# Altium footprint library Wurth_Elektronik_Electromechanic_Wire_to_Board_Connectors_rev16a.PCBLIB: 662 footprints (part 27 of 42)
Each footprint in its own frame and in the unit in brackets; x right, y up, seen from the top. Pads: shape width x height; smd on the part's side, far side on the other; paste and mask are expansions set on the pad; w line width, h text height; cw(c..) or ccw(c..) is an arc to the next point about the centre after c.
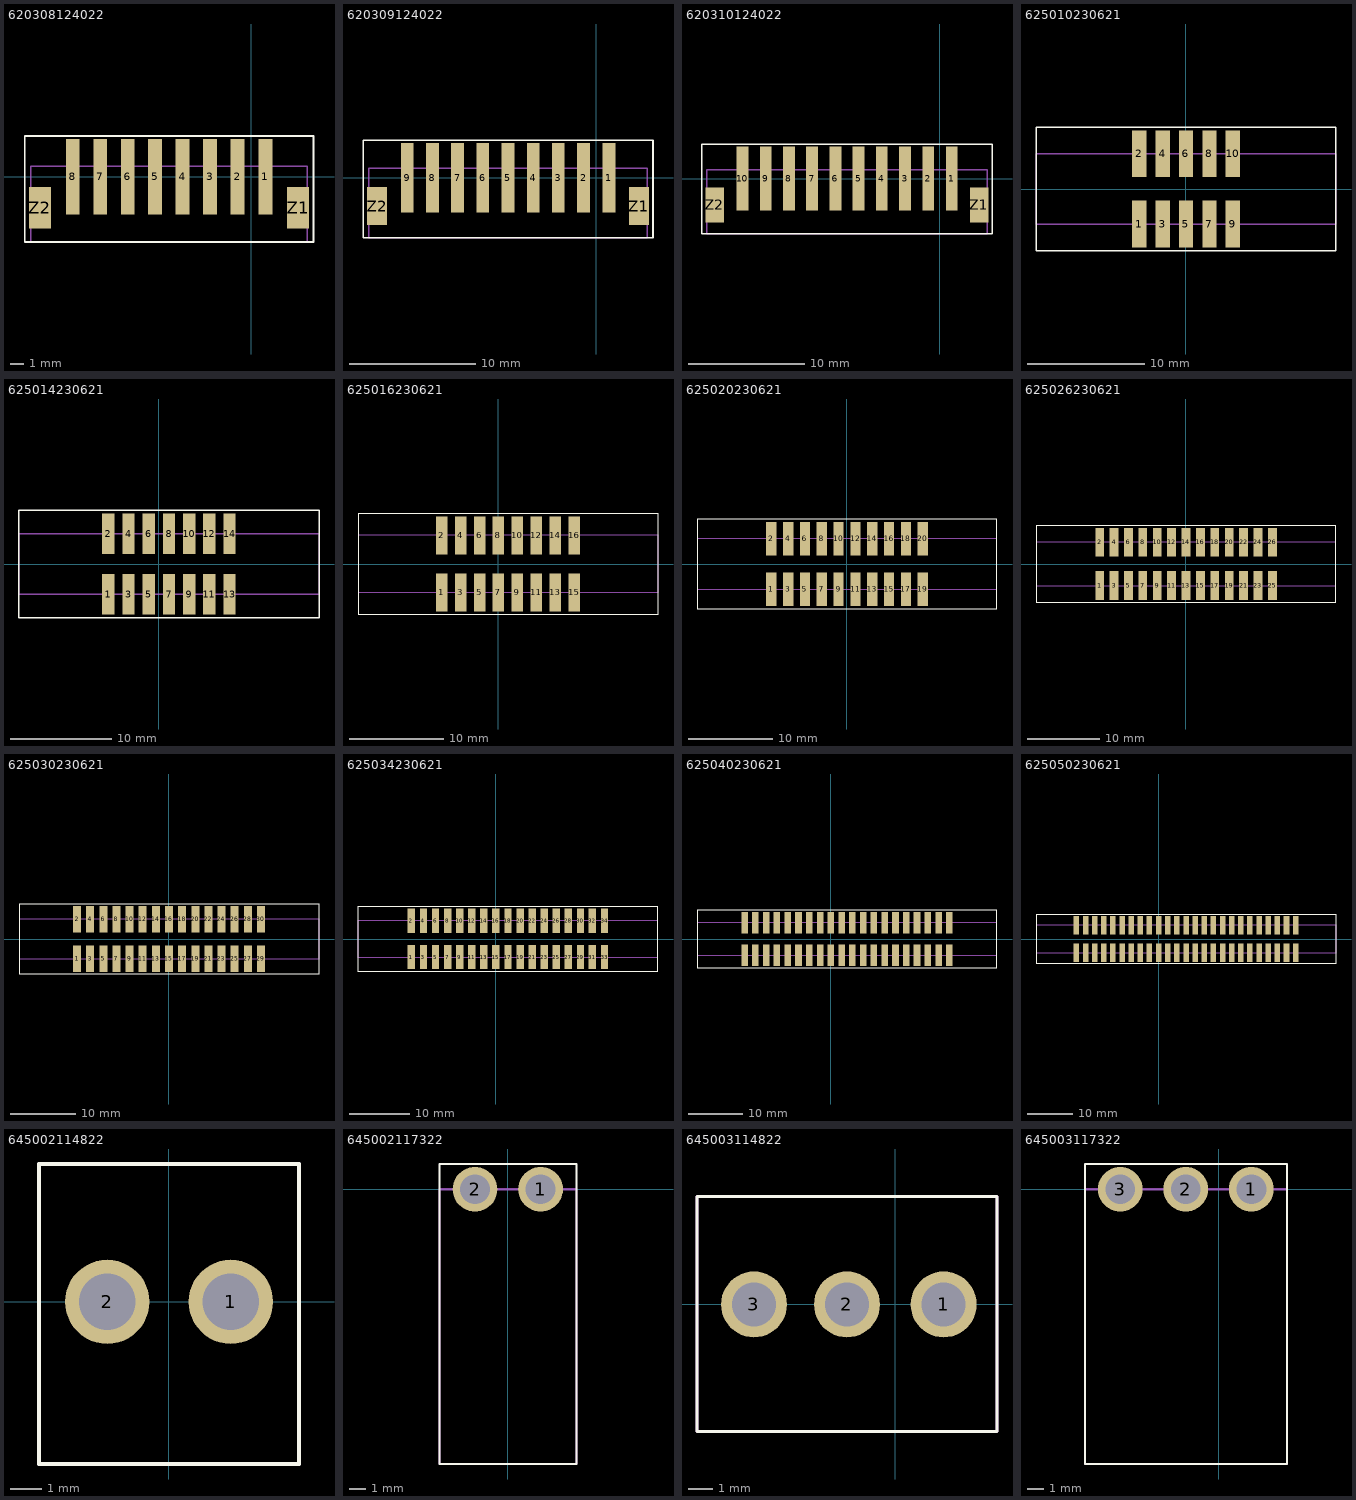
[diagram p26: the footprints below, top view; thin cyan lines are the x and y axes]

## 620308124022 [mil]
pads (10):
  rect 40x217 smd: 1(40,0) 2(-39.37,0) 3(-118.11,0) 4(-196.85,0) 5(-275.59,0) 6(-354.33,0) 7(-433.07,0) 8(-511.81,0)
  rect 63x119 smd: Z1(134,-88.58) Z2(-606.3,-88.58)
Top Overlay:
  lines w5: -649.61,-187.01 178,-187.01 178,117 -649.61,117 -649.61,-187.01
Mechanical 2:
  text ">NAME" at -350,150 h77.5
Mechanical 4:
  text ">VALUE" at -350,-250 h77.5
Mechanical 16:
  lines w5: -632.38,-187.01 160,-187.01 160,30 -632.38,30 -632.38,-187.01
  text "1" at 25,-50 h77.5

## 620309124022 [mil]
pads (11):
  rect 40x217 smd: 1(40,0) 2(-39.37,0) 3(-118.11,0) 4(-196.85,0) 5(-275.59,0) 6(-354.33,0) 7(-433.07,0) 8(-511.81,0) 9(-590.55,0)
  rect 63x119 smd: Z1(134,-88.58) Z2(-685.04,-88.58)
Top Overlay:
  lines w5: -728.35,-187.01 178,-187.01 178,117 -728.35,117 -728.35,-187.01
Mechanical 2:
  text ">NAME" at -400,150 h77.5
Mechanical 4:
  text ">VALUE" at -400,-250 h77.5
Mechanical 16:
  lines w5: -711.12,-187.01 160,-187.01 160,30 -711.12,30 -711.12,-187.01
  text "1" at 25,-50 h77.5

## 620310124022 [mil]
pads (12):
  rect 40x217 smd: 1(40,0) 2(-39.37,0) 3(-118.11,0) 4(-196.85,0) 5(-275.59,0) 6(-354.33,0) 7(-433.07,0) 8(-511.81,0) 9(-590.55,0) 10(-669.29,0)
  rect 63x119 smd: Z1(134,-88.58) Z2(-763.78,-88.58)
Top Overlay:
  lines w5: -807.09,-187.01 178,-187.01 178,117 -807.09,117 -807.09,-187.01
Mechanical 2:
  text ">NAME" at -425,150 h77.5
Mechanical 4:
  text ">VALUE" at -450,-275 h77.5
Mechanical 16:
  lines w5: -789.86,-187.01 160,-187.01 160,30 -789.86,30 -789.86,-187.01
  text "1" at 25,-50 h77.5

## 625010230621 [mil]
pads (10):
  rect 48x158 smd: 1(-157.48,-118.11) 2(-157.48,119) 3(-78.74,-118.11) 4(-78.74,119) 5(0,-118.11) 6(0,119) 7(79,-118.11) 8(79,119) 9(158,-118.11) 10(158,119)
Top Overlay:
  lines w5: -505.91,-208.66 506,-208.66 506,209 -505.91,209 -505.91,-208.66
Mechanical 2:
  text ">NAME" at -112.2,235 h77.5
Mechanical 4:
  text ">VALUE" at -133.66,-284.25 h77.5
Mechanical 16:
  lines w5: -505.91,-118.11 -505.91,119 506,119 506,-118.11 -505.91,-118.11
  text "1" at -184.06,-83.66 h77.5
  text "10" at 118,34 h77.5

## 625014230621 [mil]
pads (14):
  rect 48x158 smd: 1(-196.85,-118.11) 2(-196.85,119) 3(-118.11,-118.11) 4(-118.11,119) 5(-39.37,-118.11) 6(-39.37,119) 7(40,-118.11) 8(40,119) 9(119,-118.11) 10(119,119) 11(197,-118.11) 12(197,119) 13(276,-118.11) 14(276,119)
Top Overlay:
  lines w5: -545.28,-208.66 625,-208.66 625,209 -545.28,209 -545.28,-208.66
Mechanical 2:
  text ">NAME" at -72.83,235 h77.5
Mechanical 4:
  text ">VALUE" at -58.66,-284.25 h77.5
Mechanical 16:
  lines w5: -545.28,-118.11 -545.28,119 625,119 625,-118.11 -545.28,-118.11
  text "1" at -223.43,-83.66 h77.5
  text "14" at 236,34 h77.5

## 625016230621 [mil]
pads (16):
  rect 48x158 smd: 1(-236.22,-118.11) 2(-236.22,119) 3(-157.48,-118.11) 4(-157.48,119) 5(-78.74,-118.11) 6(-78.74,119) 7(0,-118.11) 8(0,119) 9(79,-118.11) 10(79,119) 11(158,-118.11) 12(158,119) 13(237,-118.11) 14(237,119) 15(315,-118.11) 16(315,119)
Top Overlay:
  lines w5: -584.65,-208.66 664,-208.66 664,209 -584.65,209 -584.65,-208.66
Mechanical 2:
  text ">NAME" at -62.2,235 h77.5
Mechanical 4:
  text ">VALUE" at -73.03,-284.25 h77.5
Mechanical 16:
  lines w5: -584.65,-118.11 -584.65,119 664,119 664,-118.11 -584.65,-118.11
  text "1" at -262.8,-83.66 h77.5
  text "16" at 271,34 h77.5

## 625020230621 [mil]
pads (20):
  rect 48x158 smd: 1(-354.33,-118.11) 2(-354.33,119) 3(-275.59,-118.11) 4(-275.59,119) 5(-196.85,-118.11) 6(-196.85,119) 7(-118.11,-118.11) 8(-118.11,119) 9(-39.37,-118.11) 10(-39.37,119) 11(40,-118.11) 12(40,119) 13(119,-118.11) 14(119,119) 15(197,-118.11) 16(197,119) 17(276,-118.11) 18(276,119) 19(355,-118.11) 20(355,119)
Top Overlay:
  lines w5: -702.76,-208.66 703,-208.66 703,209 -702.76,209 -702.76,-208.66
Mechanical 2:
  text ">NAME" at -105.31,235 h77.5
Mechanical 4:
  text ">VALUE" at -116.14,-284.25 h77.5
Mechanical 16:
  lines w5: -702.76,-118.11 -702.76,119 703,119 703,-118.11 -702.76,-118.11
  text "1" at -380.91,-83.66 h77.5
  text "20" at 328,34 h77.5

## 625026230621 [mil]
pads (26):
  rect 48x158 smd: 1(-472.44,-118.11) 2(-472.44,119) 3(-393.7,-118.11) 4(-393.7,119) 5(-314.96,-118.11) 6(-314.96,119) 7(-236.22,-118.11) 8(-236.22,119) 9(-157.48,-118.11) 10(-157.48,119) 11(-78.74,-118.11) 12(-78.74,119) 13(0,-118.11) 14(0,119) 15(79,-118.11) 16(79,119) 17(158,-118.11) 18(158,119) 19(237,-118.11) 20(237,119) 21(315,-118.11) 22(315,119) 23(394,-118.11) 24(394,119) 25(473,-118.11) 26(473,119)
Top Overlay:
  lines w5: -820.87,-208.66 821,-208.66 821,209 -820.87,209 -820.87,-208.66
Mechanical 2:
  text ">NAME" at -48.43,235 h77.5
Mechanical 4:
  text ">VALUE" at -34.25,-284.25 h77.5
Mechanical 16:
  lines w5: -820.87,-118.11 -820.87,119 821,119 821,-118.11 -820.87,-118.11
  text "1" at -499.02,-83.66 h77.5
  text "26" at 435,34 h77.5

## 625030230621 [mil]
pads (30):
  rect 48x158 smd: 1(-551.18,-118.11) 2(-551.18,119) 3(-472.44,-118.11) 4(-472.44,119) 5(-393.7,-118.11) 6(-393.7,119) 7(-314.96,-118.11) 8(-314.96,119) 9(-236.22,-118.11) 10(-236.22,119) 11(-157.48,-118.11) 12(-157.48,119) 13(-78.74,-118.11) 14(-78.74,119) 15(0,-118.11) 16(0,119) 17(79,-118.11) 18(79,119) 19(158,-118.11) 20(158,119) 21(237,-118.11) 22(237,119) 23(315,-118.11) 24(315,119) 25(394,-118.11) 26(394,119) 27(473,-118.11) 28(473,119) 29(552,-118.11) 30(552,119)
Top Overlay:
  lines w5: -899.61,-208.66 900,-208.66 900,209 -899.61,209 -899.61,-208.66
Mechanical 2:
  text ">NAME" at -77.17,235 h77.5
Mechanical 4:
  text ">VALUE" at -87.99,-284.25 h77.5
Mechanical 16:
  lines w5: -899.61,-118.11 -899.61,119 900,119 900,-118.11 -899.61,-118.11
  text "1" at -577.76,-83.66 h77.5
  text "30" at 506,34 h77.5

## 625034230621 [mil]
pads (34):
  rect 48x158 smd: 1(-551.18,-118.11) 2(-551.18,119) 3(-472.44,-118.11) 4(-472.44,119) 5(-393.7,-118.11) 6(-393.7,119) 7(-314.96,-118.11) 8(-314.96,119) 9(-236.22,-118.11) 10(-236.22,119) 11(-157.48,-118.11) 12(-157.48,119) 13(-78.74,-118.11) 14(-78.74,119) 15(0,-118.11) 16(0,119) 17(79,-118.11) 18(79,119) 19(158,-118.11) 20(158,119) 21(237,-118.11) 22(237,119) 23(315,-118.11) 24(315,119) 25(394,-118.11) 26(394,119) 27(473,-118.11) 28(473,119) 29(552,-118.11) 30(552,119) 31(630,-118.11) 32(630,119) 33(709,-118.11) 34(709,119)
Top Overlay:
  lines w5: -899.61,-208.66 1058,-208.66 1058,209 -899.61,209 -899.61,-208.66
Mechanical 2:
  text ">NAME" at 23,235 h77.5
Mechanical 4:
  text ">VALUE" at -12.99,-284.25 h77.5
Mechanical 16:
  lines w5: -899.61,-118.11 -899.61,119 1058,119 1058,-118.11 -899.61,-118.11
  text "1" at -577.76,-83.66 h77.5
  text "34" at 681,34 h77.5

## 625040230621 [mil]
pads (40):
  rect 48x158 smd: 1(-629.92,-118.11) 2(-629.92,119) 3(-551.18,-118.11) 4(-551.18,119) 5(-472.44,-118.11) 6(-472.44,119) 7(-393.7,-118.11) 8(-393.7,119) 9(-314.96,-118.11) 10(-314.96,119) 11(-236.22,-118.11) 12(-236.22,119) 13(-157.48,-118.11) 14(-157.48,119) 15(-78.74,-118.11) 16(-78.74,119) 17(0,-118.11) 18(0,119) 19(79,-118.11) 20(79,119) 21(158,-118.11) 22(158,119) 23(237,-118.11) 24(237,119) 25(315,-118.11) 26(315,119) 27(394,-118.11) 28(394,119) 29(473,-118.11) 30(473,119) 31(552,-118.11) 32(552,119) 33(630,-118.11) 34(630,119) 35(709,-118.11) 36(709,119) 37(788,-118.11) 38(788,119) 39(867,-118.11) 40(867,119)
Top Overlay:
  lines w5: -978.35,-208.66 1215,-208.66 1215,209 -978.35,209 -978.35,-208.66
Mechanical 2:
  text ">NAME" at 63,235 h77.5
Mechanical 4:
  text ">VALUE" at 66,-284.25 h77.5
Mechanical 16:
  lines w5: -978.35,-118.11 -978.35,119 1215,119 1215,-118.11 -978.35,-118.11
  text "1" at -656.5,-83.66 h77.5
  text "40" at 828,59 h77.5

## 625050230621 [mil]
pads (50):
  rect 48x158 smd: 1(-708.66,-118.11) 2(-708.66,119) 3(-629.92,-118.11) 4(-629.92,119) 5(-551.18,-118.11) 6(-551.18,119) 7(-472.44,-118.11) 8(-472.44,119) 9(-393.7,-118.11) 10(-393.7,119) 11(-314.96,-118.11) 12(-314.96,119) 13(-236.22,-118.11) 14(-236.22,119) 15(-157.48,-118.11) 16(-157.48,119) 17(-78.74,-118.11) 18(-78.74,119) 19(0,-118.11) 20(0,119) 21(79,-118.11) 22(79,119) 23(158,-118.11) 24(158,119) 25(237,-118.11) 26(237,119) 27(315,-118.11) 28(315,119) 29(394,-118.11) 30(394,119) 31(473,-118.11) 32(473,119) 33(552,-118.11) 34(552,119) 35(630,-118.11) 36(630,119) 37(709,-118.11) 38(709,119) 39(788,-118.11) 40(788,119) 41(867,-118.11) 42(867,119) 43(945,-118.11) 44(945,119) 45(1024,-118.11) 46(1024,119) 47(1103,-118.11) 48(1103,119) 49(1182,-118.11) 50(1182,119)
Top Overlay:
  lines w5: -1057.09,-208.66 1530,-208.66 1530,209 -1057.09,209 -1057.09,-208.66
Mechanical 2:
  text ">NAME" at -16.54,235 h77.5
Mechanical 4:
  text ">VALUE" at -12.99,-284.25 h77.5
Mechanical 16:
  lines w5: -1057.09,-118.11 -1057.09,119 1530,119 1530,-118.11 -1057.09,-118.11
  text "1" at -735.24,-83.66 h77.5
  text "50" at 1142,40 h77.5

## 645002114822 [mil]
pads (2):
  round 106.5 hole 71: 1(78,0) 2(-77.95,0)
Top Overlay:
  lines w5: -163.98,-204.72 164,-204.72 164,174 -163.98,174 -163.98,-204.72
Mechanical 2:
  text ">NAME" at 225,0 h77.5
Mechanical 4:
  text ">VALUE" at 234,-77.95 h77.5
Mechanical 16:
  lines w5: -163.98,-204.72 -163.98,174 164,174 164,-204.72 -163.98,-204.72
  text "1" at 50,-25 h77.5
  text "2" at -100,-25 h77.5

## 645002117322 [mil]
pads (2):
  round 106.5 hole 71: 1(78,0) 2(-77.95,0)
Top Overlay:
  lines w5: -162.01,-653.54 163,-653.54 163,60 -162.01,60 -162.01,-653.54
Mechanical 2:
  text ">NAME" at 225,0 h77.5
Mechanical 4:
  text ">VALUE" at 234,-77.95 h77.5
Mechanical 16:
  lines w5: -162.01,-653.54 -162.01,0 163,0 163,-653.54 -162.01,-653.54
  text "1" at 50,-25 h77.5
  text "2" at -100,-25 h77.5

## 645003114822 [mil]
pads (3):
  round 106.5 hole 71: 1(78,0) 2(-77.95,0) 3(-227.95,0)
Top Overlay:
  lines w5: -319.88,-204.72 164,-204.72 164,174 -319.88,174 -319.88,-204.72
Mechanical 2:
  text ">NAME" at 225,0 h77.5
Mechanical 4:
  text ">VALUE" at 234,-77.95 h77.5
Mechanical 16:
  lines w5: -319.88,-204.72 -319.88,174 164,174 164,-204.72 -319.88,-204.72
  text "1" at 50,-25 h77.5
  text "3" at -250,-25 h77.5

## 645003117322 [mil]
pads (3):
  round 106.5 hole 71: 1(78,0) 2(-77.95,0) 3(-233.86,0)
Top Overlay:
  lines w5: -317.91,-653.54 163,-653.54 163,60 -317.91,60 -317.91,-653.54
Mechanical 2:
  text ">NAME" at 225,0 h77.5
Mechanical 4:
  text ">VALUE" at 234,-77.95 h77.5
Mechanical 16:
  lines w5: -317.91,-653.54 -317.91,0 163,0 163,-653.54 -317.91,-653.54
  text "1" at 50,-25 h77.5
  text "3" at -255.91,-25 h77.5